# Altium footprint library PCB SOM AM625.PcbLib: 64 footprints (part 4 of 4)
Each footprint in its own frame and in the unit in brackets; x right, y up, seen from the top. Pads: shape width x height; smd on the part's side, far side on the other; paste and mask are expansions set on the pad; w line width, h text height; cw(c..) or ccw(c..) is an arc to the next point about the centre after c.
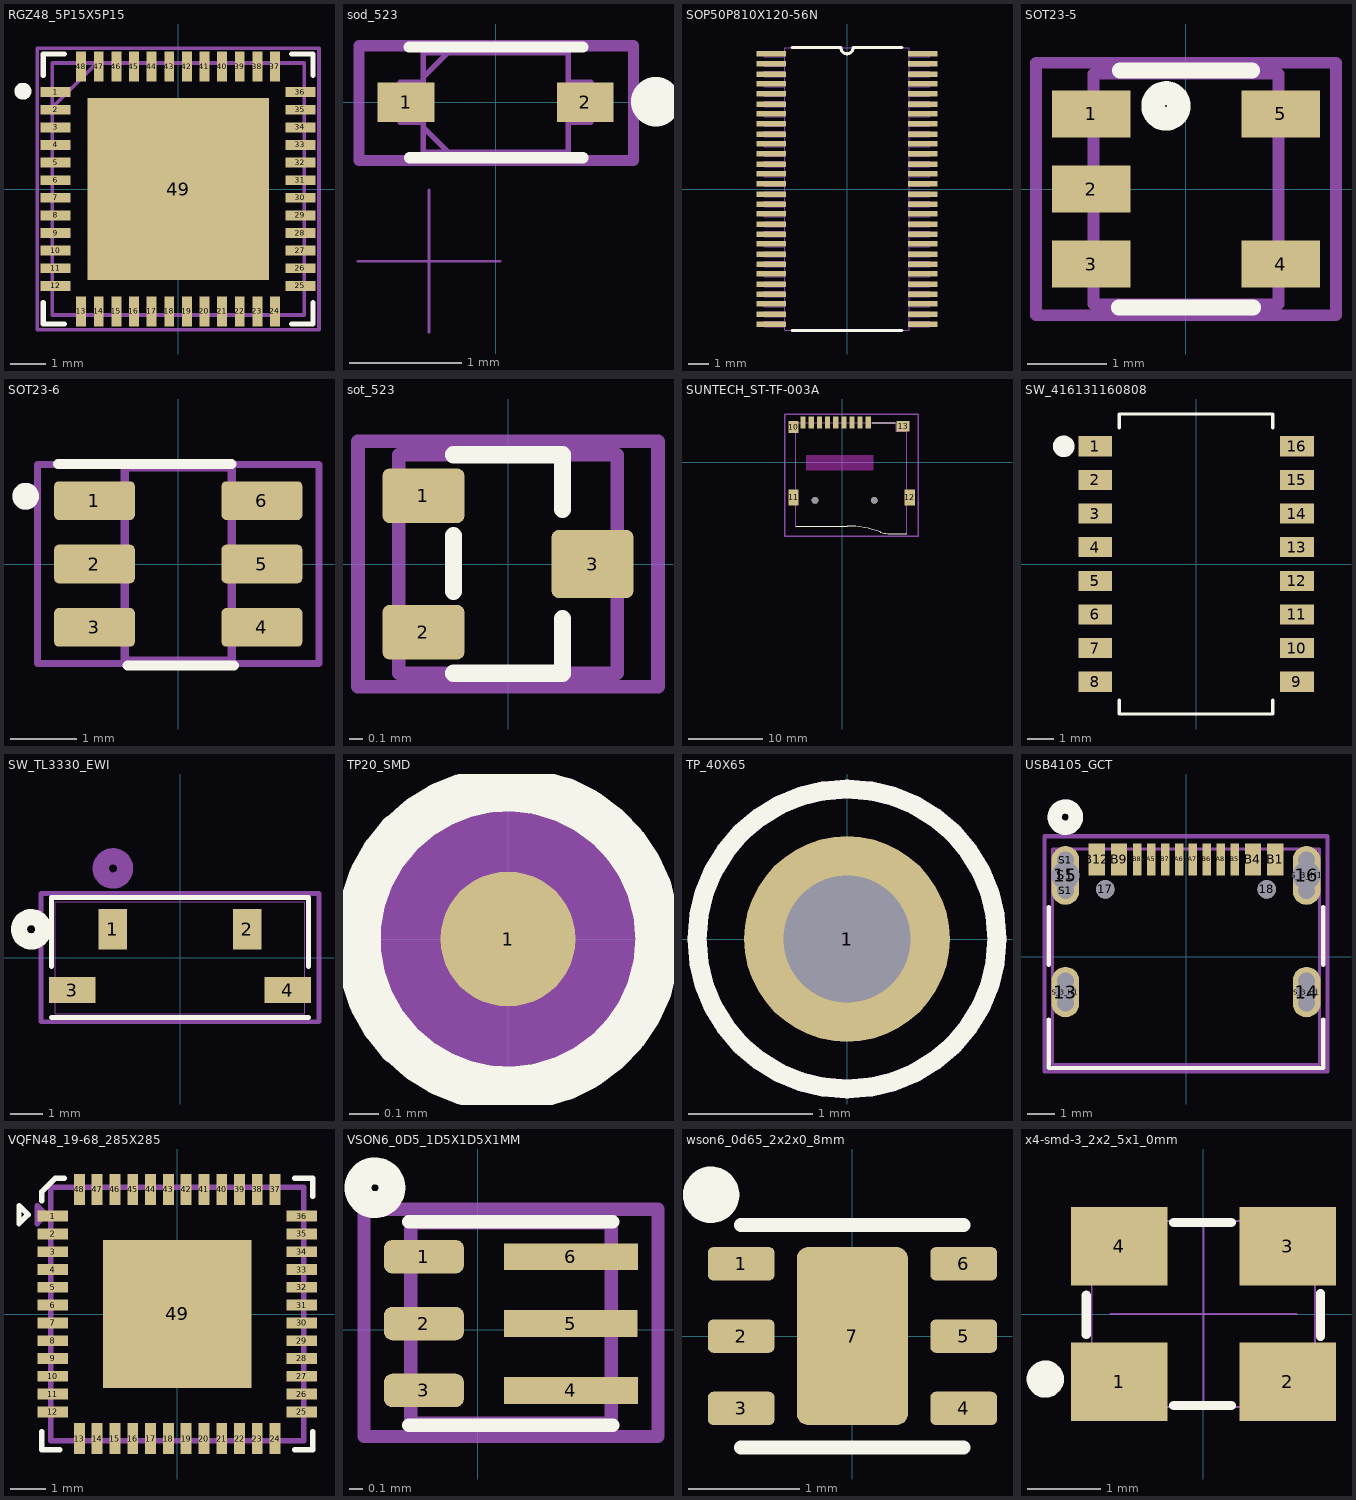
[diagram p3: the footprints below, top view; thin cyan lines are the x and y axes]

## RGZ48_5P15X5P15 [mm]
pads (49):
  rect 0.85x0.28 smd paste-0.412 mask-0.419: 1(-3.475,2.75) 2(-3.475,2.25) 3(-3.475,1.75) 4(-3.475,1.25) 5(-3.475,0.75) 6(-3.475,0.25) 7(-3.475,-0.25) 8(-3.475,-0.75) 9(-3.475,-1.25) 10(-3.475,-1.75) 11(-3.475,-2.25) 12(-3.475,-2.75) 25(3.475,-2.75) 26(3.475,-2.25) 27(3.475,-1.75) 28(3.475,-1.25) 29(3.475,-0.75) 30(3.475,-0.25) 31(3.475,0.25) 32(3.475,0.75) 33(3.475,1.25) 34(3.475,1.75) 35(3.475,2.25) 36(3.475,2.75)
  rect 0.28x0.85 smd paste-0.412 mask-0.419: 13(-2.751,-3.475) 14(-2.251,-3.475) 15(-1.75,-3.475) 16(-1.25,-3.475) 17(-0.75,-3.475) 18(-0.25,-3.475) 19(0.25,-3.475) 20(0.75,-3.475) 21(1.25,-3.475) 22(1.75,-3.475) 23(2.251,-3.475) 24(2.751,-3.475) 37(2.751,3.475) 38(2.251,3.475) 39(1.75,3.475) 40(1.25,3.475) 41(0.75,3.475) 42(0.25,3.475) 43(-0.25,3.475) 44(-0.75,3.475) 45(-1.25,3.475) 46(-1.75,3.475) 47(-2.251,3.475) 48(-2.751,3.475)
  rect 5.15x5.15 smd paste-2.562 mask-2.565: 49(0,0)
Top Overlay:
  circle w0.254: c-4.4,2.775 r0.112
  lines w0.152: -3.829,-3.223 -3.829,-3.829 -3.223,-3.829 ; -3.829,3.223 -3.829,3.829 -3.223,3.829 ; 3.223,-3.829 3.829,-3.829 3.829,-3.223 ; 3.223,3.829 3.829,3.829 3.829,3.223
Top Paste:
  drawing of 97 lines, arcs and shapes, not listed
Top Solder:
  drawing of 62 lines, arcs and shapes, not listed
Top CMT:
  lines w0.1: -4,-4 -4,4 4,4 4,-4 -4,-4
Top ASM:
  lines w0.1: -3.575,2.305 -2.305,3.575 ; -3.575,-3.575 3.575,-3.575 3.575,3.575 -3.575,3.575 -3.575,-3.575 ; -3.575,-2.9 -3.575,-2.6 -3.575,-2.9 ; -3.575,-2.4 -3.575,-2.1 -3.575,-2.4 ; -3.575,-1.9 -3.575,-1.6 -3.575,-1.9 ; -3.575,-1.4 -3.575,-1.1 -3.575,-1.4 ; -3.575,-0.9 -3.575,-0.6 -3.575,-0.9 ; -3.575,-0.4 -3.575,-0.1 -3.575,-0.4 ; -3.575,0.1 -3.575,0.4 -3.575,0.1 ; -3.575,0.6 -3.575,0.9 -3.575,0.6 ; -3.575,1.1 -3.575,1.4 -3.575,1.1 ; -3.575,1.6 -3.575,1.9 -3.575,1.6 ; -3.575,2.1 -3.575,2.4 -3.575,2.1 ; -3.575,2.6 -3.575,2.9 -3.575,2.6 ; -2.9,-3.575 -2.6,-3.575 -2.9,-3.575 ; -2.9,3.575 -2.6,3.575 -2.9,3.575 ; -2.4,-3.575 -2.1,-3.575 -2.4,-3.575 ; -2.4,3.575 -2.1,3.575 -2.4,3.575 ; -1.9,-3.575 -1.6,-3.575 -1.9,-3.575 ; -1.9,3.575 -1.6,3.575 -1.9,3.575 ; -1.4,-3.575 -1.1,-3.575 -1.4,-3.575 ; -1.4,3.575 -1.1,3.575 -1.4,3.575 ; -0.9,-3.575 -0.6,-3.575 -0.9,-3.575 ; -0.9,3.575 -0.6,3.575 -0.9,3.575 ; -0.4,-3.575 -0.1,-3.575 -0.4,-3.575 ; -0.4,3.575 -0.1,3.575 -0.4,3.575 ; 0.1,-3.575 0.4,-3.575 0.1,-3.575 ; 0.1,3.575 0.4,3.575 0.1,3.575 ; 0.6,-3.575 0.9,-3.575 0.6,-3.575 ; 0.6,3.575 0.9,3.575 0.6,3.575 ; 1.1,-3.575 1.4,-3.575 1.1,-3.575 ; 1.1,3.575 1.4,3.575 1.1,3.575 ; 1.6,-3.575 1.9,-3.575 1.6,-3.575 ; 1.6,3.575 1.9,3.575 1.6,3.575 ; 2.1,-3.575 2.4,-3.575 2.1,-3.575 ; 2.1,3.575 2.4,3.575 2.1,3.575 ; 2.6,-3.575 2.9,-3.575 2.6,-3.575 ; 2.6,3.575 2.9,3.575 2.6,3.575 ; 3.575,-2.9 3.575,-2.6 3.575,-2.9 ; 3.575,-2.4 3.575,-2.1 3.575,-2.4 ; 3.575,-1.9 3.575,-1.6 3.575,-1.9 ; 3.575,-1.4 3.575,-1.1 3.575,-1.4 ; 3.575,-0.9 3.575,-0.6 3.575,-0.9 ; 3.575,-0.4 3.575,-0.1 3.575,-0.4 ; 3.575,0.1 3.575,0.4 3.575,0.1 ; 3.575,0.6 3.575,0.9 3.575,0.6 ; 3.575,1.1 3.575,1.4 3.575,1.1 ; 3.575,1.6 3.575,1.9 3.575,1.6 ; 3.575,2.1 3.575,2.4 3.575,2.1 ; 3.575,2.6 3.575,2.9 3.575,2.6
3D body "RGZ48_5P15X5P15.step": height 1.4, standoff 0, extent -3.626,-3.626 3.626,3.626

## sod_523 [mil]
pads (2):
  rect 20x14 smd paste+0: 1(-31.5,0) 2(31.5,0)
Top Overlay:
  circle w15.75: c56.32,0.22 r0.79
  lines w3.94: -30.36,19.47 30.64,19.47 ; -30.27,-19.46 30.73,-19.46
Mechanical 17:
  lines w1: -48.41,-55.88 1.59,-55.88 ; -23.41,-80.88 -23.41,-30.88
Top CMT:
  lines w3.94: -48.01,-20.45 -48.01,19.91 48.44,19.91 48.44,-20.45 -48.01,-20.45
Top ASM:
  lines w1.97: -25.5,-8.75 -16.75,-17.5 ; -25.5,8.75 -16.75,17.5 ; -33.5,-7 -33.5,7 -25.5,7 -25.5,-7 -33.5,-7 ; -25.5,-17.5 25.5,-17.5 25.5,17.5 -25.5,17.5 -25.5,-17.5 ; 25.5,-7 33.5,-7 33.5,7 25.5,7 25.5,-7
3D body "SOD-523_0P9X1P3_ONS.step": height 18.27, standoff 0, extent -33.5,-17.48 33.5,17.48

## SOP50P810X120-56N [mil]
pads (56):
  rect 58x11 smd: 1(-149,266) 2(-149,246) 3(-149,226) 4(-149,207) 5(-149,187) 6(-149,167) 7(-149,148) 8(-149,128) 9(-149,108) 10(-149,89) 11(-149,69) 12(-149,49) 13(-149,30) 14(-149,10) 15(-149,-10) 16(-149,-30) 17(-149,-49) 18(-149,-69) 19(-149,-89) 20(-149,-108) 21(-149,-128) 22(-149,-148) 23(-149,-167) 24(-149,-187) 25(-149,-207) 26(-149,-226) 27(-149,-246) 28(-149,-266) 29(149,-266) 30(149,-246) 31(149,-226) 32(149,-207) 33(149,-187) 34(149,-167) 35(149,-148) 36(149,-128) 37(149,-108) 38(149,-89) 39(149,-69) 40(149,-49) 41(149,-30) 42(149,-10) 43(149,10) 44(149,30) 45(149,49) 46(149,69) 47(149,89) 48(149,108) 49(149,128) 50(149,148) 51(149,167) 52(149,187) 53(149,207) 54(149,226) 55(149,246) 56(149,266)
Top Overlay:
  lines w6: -108,-278 108,-278 ; -108,278 -12,278 ccw(c0,278) 12,278 108,278
Mechanical 13:
  drawing of 231 lines, arcs and shapes, not listed
3D body "SN75LVDS82DGGR.step": height 47.24, standoff 0, extent -159.45,-275.59 159.45,275.59

## SOT23-5 [mm]
height 2
pads (5):
  rect 1x0.6 smd: 1(-1.2,0.95) 2(-1.2,0) 3(-1.2,-0.95) 4(1.2,-0.95) 5(1.2,0.95)
Top Overlay:
  circle w0.3: c-0.254,1.052 r0.163
  lines w0.2: -0.851,-1.5 0.851,-1.5 ; -0.838,1.5 0.838,1.5
Top CMT:
  lines w0.15: -1.9,-1.6 -1.9,1.6 1.9,1.6 1.9,-1.6 -1.9,-1.6
Top ASM:
  lines w0.15: -1.17,-1.46 -1.17,1.46 1.17,1.46 1.17,-1.46 -1.17,-1.46
3D body "User Library-sot235.step": height 1, standoff 0, extent -1.17,-1.46 1.17,1.46

## SOT23-6 [mm]
pads (6):
  rrect25% 1.21x0.58 smd: 1(-1.255,0.95) 2(-1.255,0) 3(-1.255,-0.95) 4(1.255,-0.95) 5(1.255,0) 6(1.255,0.95)
Top Overlay:
  circle w0.2: c-2.286,1.016 r0.1
  lines w0.15: -1.8,1.5 0.8,1.5 ; -0.762,-1.524 0.838,-1.524
Top CMT:
  lines w0.1: -2.11,-1.49 -1.05,-1.49 1.05,-1.49 2.11,-1.49 2.11,1.49 1.05,1.49 -1.05,1.49 -2.11,1.49 -2.11,-1.49
Top ASM:
  circle w0.2: c-2.286,1.016 r0.1
  lines w0.127: -0.8,-1.45 0.8,-1.45 0.8,1.45 -0.8,1.45 -0.8,-1.45
3D body "SOT23-6-2.step": height 1.45, standoff 0, extent -1.4,-1.45 1.4,1.45

## sot_523 [mm]
pads (3):
  rrect25% 0.6x0.4 smd: 1(-0.62,0.5) 2(-0.62,-0.5)
  rrect20% 0.6x0.5 smd: 3(0.62,0)
Top Overlay:
  lines w0.127: -0.4,-0.8 0.4,-0.8 0.4,-0.4 ; -0.4,-0.2 -0.4,0.208 ; -0.4,0.8 0.4,0.8 0.4,0.4
Top CMT:
  lines w0.1: -1.1,-0.9 1.1,-0.9 1.1,0.9 -1.1,0.9 -1.1,-0.9
  text ".Comment" at -1.095,-0.101 h0.6
Top ASM:
  lines w0.1: -0.8,-0.8 0.8,-0.8 0.8,0.8 -0.8,0.8 -0.8,-0.8
  text "'.Designator'" at -1.52,-0.101 h0.6
3D body "SOT-523.step": height 0.8, standoff 0, extent -0.8,-0.8 0.8,0.8

## SUNTECH_ST-TF-003A [mm]
pads (15):
  rect 0.7x1.6 smd: 1(3.52,5.33) 2(2.42,5.33) 3(1.32,5.33) 4(0.22,5.33) 5(-0.88,5.33) 6(-1.98,5.33) 7(-3.08,5.33) 8(-4.18,5.33) 9(-5.28,5.33)
  rect 1.4x1.6 smd: 10(-6.58,4.73)
  rect 1.4x2.2 smd: 11(-6.58,-4.77) 12(9.12,-4.77)
  rect 1.8x1.4 smd: 13(8.22,4.83)
  round 0.9 hole 0.9 unplated: ""(-3.68,-5.17) ""(4.32,-5.17)
Top Overlay:
  lines w0.127: -6.287,-8.64 0.647,-8.64 cw(c0.647,-21.34) 5.198,-9.484 ; 4.07,5.33 7.17,5.33 ; 5.161,-9.469 ccw(c6.168,-6.847) 6.168,-9.656 8.699,-9.656
Keep-Out Layer:
  region: 4.172,-1.073 -4.833,-1.073 -4.833,0.928 4.172,0.928
Top CMT:
  lines w0.2: -7.75,-10 10.25,-10 10.25,6.5 -7.75,6.5 -7.75,-10
Top ASM:
  lines w0.127: -6.287,-8.64 -6.287,5.33 7.302,5.33 7.302,4.187 8.699,4.187 8.699,-9.656
3D body "Micro_SD_Card_and_Holder.stp": height 2.15, standoff -0.33, extent -6.95,-11.626 9.35,5.9

## SW_416131160808 [mm]
pads (16):
  rect 1.27x0.76 smd: 1(-3.81,4.445) 2(-3.81,3.175) 3(-3.81,1.905) 4(-3.81,0.635) 5(-3.81,-0.635) 6(-3.81,-1.905) 7(-3.81,-3.175) 8(-3.81,-4.445) 9(3.81,-4.445) 10(3.81,-3.175) 11(3.81,-1.905) 12(3.81,-0.635) 13(3.81,0.635) 14(3.81,1.905) 15(3.81,3.175) 16(3.81,4.445)
Top Overlay:
  circle w0.4: c-5,4.445 r0.207
  lines w0.127: -2.9,-5.138 -2.9,-5.665 2.9,-5.665 2.9,-5.138 ; -2.9,5.138 -2.9,5.665 2.9,5.665 2.9,5.138
3D body "416131160808_Download_STP_416131160808_rev1.stp": height 2.7, standoff 0, extent -4.22,-5.665 4.22,5.665

## SW_TL3330_EWI [mil]
pads (4):
  rect 35x50 smd paste+0 mask+0: 1(-82.68,35) 2(82.68,35)
  rect 57x32 smd paste-28.5 mask-28.5: 3(-132.87,-40) 4(132.87,-40)
Top Overlay:
  circle w20: c-183.5,35 r15
  lines w6: -158.5,-74 158.5,-74 ; -158.5,-10.9 -158.5,74 158.5,74 158.5,-10.9
Bottom Overlay:
  circle w20: c-183.5,35 r15
Mechanical 13:
  circle w20: c-82.68,110 r15
  lines w1: -153.5,-69 -153.5,69 153.5,69 153.5,-69 -153.5,-69
Mechanical 15:
  lines w6: -171.37,-79 171.37,-79 171.37,79 -171.37,79 -171.37,-79
3D body "IT-1188E.STEP": height 137.8, standoff -27.56, extent -153.54,-90.55 153.54,51.18

## TP20_SMD [mil] "TP20_SMD"
pads (1):
  round 18 smd: 1(0,0)
Top Overlay:
  circle w6: c0,0 r20
Top Courtyard:
  dashed: -17.33,0 -16.01,-6.63 -12.26,-12.26 -6.63,-16.01 0,-17.33 6.63,-16.01 8.52,-14.75 12.26,-12.26 16.01,-6.63 17.33,0 16.01,6.63 12.26,12.26 8.52,14.75 6.63,16.01 0,17.33 -6.63,16.01 -12.26,12.26 -16.01,6.63
Mechanical 49:
  text "1" at 4.59,-3.33 h10
Top Assembly (Mech50):
  circle w6: c0,0 r10

## TP_40X65 [mil] "TP_40X65"
pads (1):
  round 65 hole 40: 1(0,0)
Top Overlay:
  circle w6: c0,0 r47.43
Mechanical 49:
  text "1" at -3.41,-3.33 h10
Top Assembly (Mech50):
  circle w6: c0,0 r47.43

## USB4105_GCT [mil]
pads (30):
  oval 39x71 smd paste-35.5 mask+4: 13(-170.08,-49.97) 14(170.08,-49.97)
  oval 39x83 smd paste-41.5 mask+4: 15(-170.08,114.6) 16(170.08,114.6)
  round 26 / inner round 60 / far side round 26 hole 26 unplated paste-13 mask+4: 17(-113.78,94.91) 18(113.78,94.91)
  rect 12x45 smd paste+0 mask+4: A5(-49.21,137.24) A6(-9.84,137.24) A7(9.84,137.24) A8(49.21,137.24) B5(68.9,137.24) B6(29.53,137.24) B7(-29.53,137.24) B8(-68.9,137.24)
  rect 23x45 smd paste+0 mask+4: B1(125.98,137.24) B4(94.49,137.24) B9(-94.49,137.24) B12(-125.98,137.24)
  round 24 / inner round 60 / far side round 24 hole 24 unplated paste-12 mask+4: S1(-170.08,93.1) S_1_H1(-170.08,-34.47) S_1_H2(-170.08,-65.47) S_2_H1(170.08,-34.47) S_2_H2(170.08,-65.47) S_4_H1(170.08,136.1) S_4_H2(170.08,93.1)
  oval 24.02x59.06 hole 39.37 square unplated paste-12 mask+4: S1(-170.08,114.6) S_3_H1(170.08,114.6)
  round 24.02 / inner round 60 / far side round 24 hole 24 unplated paste-12 mask+4: S1(-170.08,136.1)
  oval 24.02x47.24 hole 29.53 square unplated paste-12 mask+4: S_3_H1(-170.08,-49.97) S_3_H1(170.08,-49.97)
Top Overlay:
  circle w20: c-170.28,196.85 r15
  lines w6: -193.5,-88.64 -193.5,-157 193.5,-157 193.5,-88.64 ; -193.5,-11.29 -193.5,69.92 ; 193.5,-11.29 193.5,69.92
Multi-Layer:
  lines w24: -170.08,-65.47 -170.08,-34.47 ; -170.08,93.1 -170.08,136.1 ; 170.08,-65.47 170.08,-34.47 ; 170.08,93.1 170.08,136.1
Top CMT:
  lines w6: -199.58,-162 199.58,-162 199.58,169.74 -199.58,169.74 -199.58,-162
Top ASM:
  circle w20: c-170.28,196.85 r15
  lines w3.94: -188.5,-152 188.5,-152 188.5,152 -188.5,152 -188.5,-152
3D body "USB_type_C_smd_12p.stp": height 126.77, standoff -49.24, extent -181.1,-158.47 181.1,154.53

## VQFN48_19-68_285X285 [mil] "VQFN48_19-68_285X285"
pads (49):
  rect 34x12 smd: 1(-137.8,108.27) 2(-137.8,88.58) 3(-137.8,68.9) 4(-137.8,49.21) 5(-137.8,29.53) 6(-137.8,9.84) 7(-137.8,-9.84) 8(-137.8,-29.53) 9(-137.8,-49.21) 10(-137.8,-68.9) 11(-137.8,-88.58) 12(-137.8,-108.27) 25(137.8,-108.27) 26(137.8,-88.58) 27(137.8,-68.9) 28(137.8,-49.21) 29(137.8,-29.53) 30(137.8,-9.84) 31(137.8,9.84) 32(137.8,29.53) 33(137.8,49.21) 34(137.8,68.9) 35(137.8,88.58) 36(137.8,108.27)
  rect 12x34 smd: 13(-108.27,-137.8) 14(-88.58,-137.8) 15(-68.9,-137.8) 16(-49.21,-137.8) 17(-29.53,-137.8) 18(-9.84,-137.8) 19(9.84,-137.8) 20(29.53,-137.8) 21(49.21,-137.8) 22(68.9,-137.8) 23(88.58,-137.8) 24(108.27,-137.8) 37(108.27,137.8) 38(88.58,137.8) 39(68.9,137.8) 40(49.21,137.8) 41(29.53,137.8) 42(9.84,137.8) 43(-9.84,137.8) 44(-29.53,137.8) 45(-49.21,137.8) 46(-68.9,137.8) 47(-88.58,137.8) 48(-108.27,137.8)
  rect 164x164 smd: 49(0,0)
Top Overlay:
  lines w6: -150,-130 -150,-150 -130,-150 ; -150,125 -150,135 -135,150 -125,150 ; 130,-150 150,-150 150,-130 ; 130,150 150,150 150,130 ; -175,100 -165,110 -175,120 -175,100
Top Paste:
  lines w1: -76.97,-76.97 -76.97,-30.91 -30.91,-30.91 -30.91,-76.97 -76.97,-76.97 ; -76.97,-23.03 -76.97,23.03 -30.91,23.03 -30.91,-23.03 -76.97,-23.03 ; -76.97,30.91 -76.97,76.97 -30.91,76.97 -30.91,30.91 -76.97,30.91 ; -23.03,-76.97 23.03,-76.97 23.03,-30.91 -23.03,-30.91 -23.03,-76.97 ; -23.03,-23.03 23.03,-23.03 23.03,23.03 -23.03,23.03 -23.03,-23.03 ; -23.03,30.91 23.03,30.91 23.03,76.97 -23.03,76.97 -23.03,30.91 ; 30.91,-76.97 30.91,-30.91 76.97,-30.91 76.97,-76.97 30.91,-76.97 ; 30.91,-23.03 30.91,23.03 76.97,23.03 76.97,-23.03 30.91,-23.03 ; 30.91,30.91 30.91,76.97 76.97,76.97 76.97,30.91 30.91,30.91
Top Solder:
  lines w1: -156.8,-116.27 -156.8,116.27 -118.8,116.27 -118.8,-116.27 -156.8,-116.27 ; -116.27,-156.8 116.27,-156.8 116.27,-118.8 -116.27,-118.8 -116.27,-156.8 ; -116.27,118.8 116.27,118.8 116.27,156.8 -116.27,156.8 -116.27,118.8 ; 118.8,-116.27 118.8,116.27 156.8,116.27 156.8,-116.27 118.8,-116.27
Top Assembly (Mech50):
  lines w6: -155,100 -145,110 -155,120 -155,100 ; -140,-140 140,-140 140,140 -140,140 -140,-140
3D body "RGZ48_5P15X5P15.step": height 55.12, standoff 0, extent -142.75,-142.75 142.76,142.76

## VSON6_0D5_1D5X1D5X1MM [mm] "VSON6_0D5_1D5X1D5X1MM"
pads (6):
  rrect50% 0.6x0.25 smd: 1(-0.402,0.545) 2(-0.402,0.045) 3(-0.402,-0.455)
  rect 1x0.2 smd: 4(0.699,-0.455) 5(0.698,0.045) 6(0.699,0.545)
Top Overlay:
  circle w0.2: c-0.768,1.061 r0.127
  lines w0.1: -0.514,-0.717 1.01,-0.717 ; -0.514,0.807 1.01,0.807
Top CMT:
  lines w0.1: -0.85,-0.8 1.35,-0.8 1.35,0.9 -0.85,0.9 -0.85,-0.8
  text ".Comment" at -0.675,-0.225 h0.6
Top ASM:
  lines w0.1: -0.5,-0.7 1,-0.7 1,0.8 -0.5,0.8 -0.5,-0.7
  text "'.Designator'" at -1.1,-0.225 h0.6
3D body "User Library-DMQ0006A.STEP": height 1, standoff 0, extent -0.5,-0.7 1,0.8

## wson6_0d65_2x2x0_8mm [mm]
pads (7):
  rrect33% 0.6x0.3 smd: 1(-1,0.65) 2(-1,0) 3(-1,-0.65) 4(1,-0.65) 5(1,0) 6(1,0.65)
  rrect20% 1x1.6 smd: 7(0,0)
Top Overlay:
  circle w0.254: c-1.27,1.27 r0.127
  lines w0.127: -1,-1 1,-1 ; -1,1 1,1
3D body "TVS0500DRVR.step": height 0.8, standoff 0, extent -1,-1 1,1

## x4-smd-3_2x2_5x1_0mm [mil]
pads (4):
  rect 52x42 smd: 1(-45.28,-36.42) 2(45.28,-36.42) 3(45.28,36.42) 4(-45.28,36.42)
Top Overlay:
  circle w10: c-85,-35 r5
  lines w5: -62.99,-11 -63,10 ; -16,-49.21 15,-49.21 ; -16,49.21 15,49.21 ; 62.99,-12 62.99,11
Mechanical 17:
  lines w1: -25,0 25,0 ; 0,-25 0,25
Bottom CMT:
  circle w1: c-45,-35 r13.42
  lines w1: -60,-50 60,-50 60,50 -60,50 -60,-50
Mechanical 24:
  lines w1: -50,0 50,0 ; 0,-50 0,50
3D body "User Library-3225-1.x_t": height 24.02, standoff 0, extent -62.99,-49.21 62.99,49.21